# Altium footprint library Connectors.PcbLib: 79 footprints (part 4 of 5)
Each footprint in its own frame and in the unit in brackets; x right, y up, seen from the top. Pads: shape width x height; smd on the part's side, far side on the other; paste and mask are expansions set on the pad; w line width, h text height; cw(c..) or ccw(c..) is an arc to the next point about the centre after c.
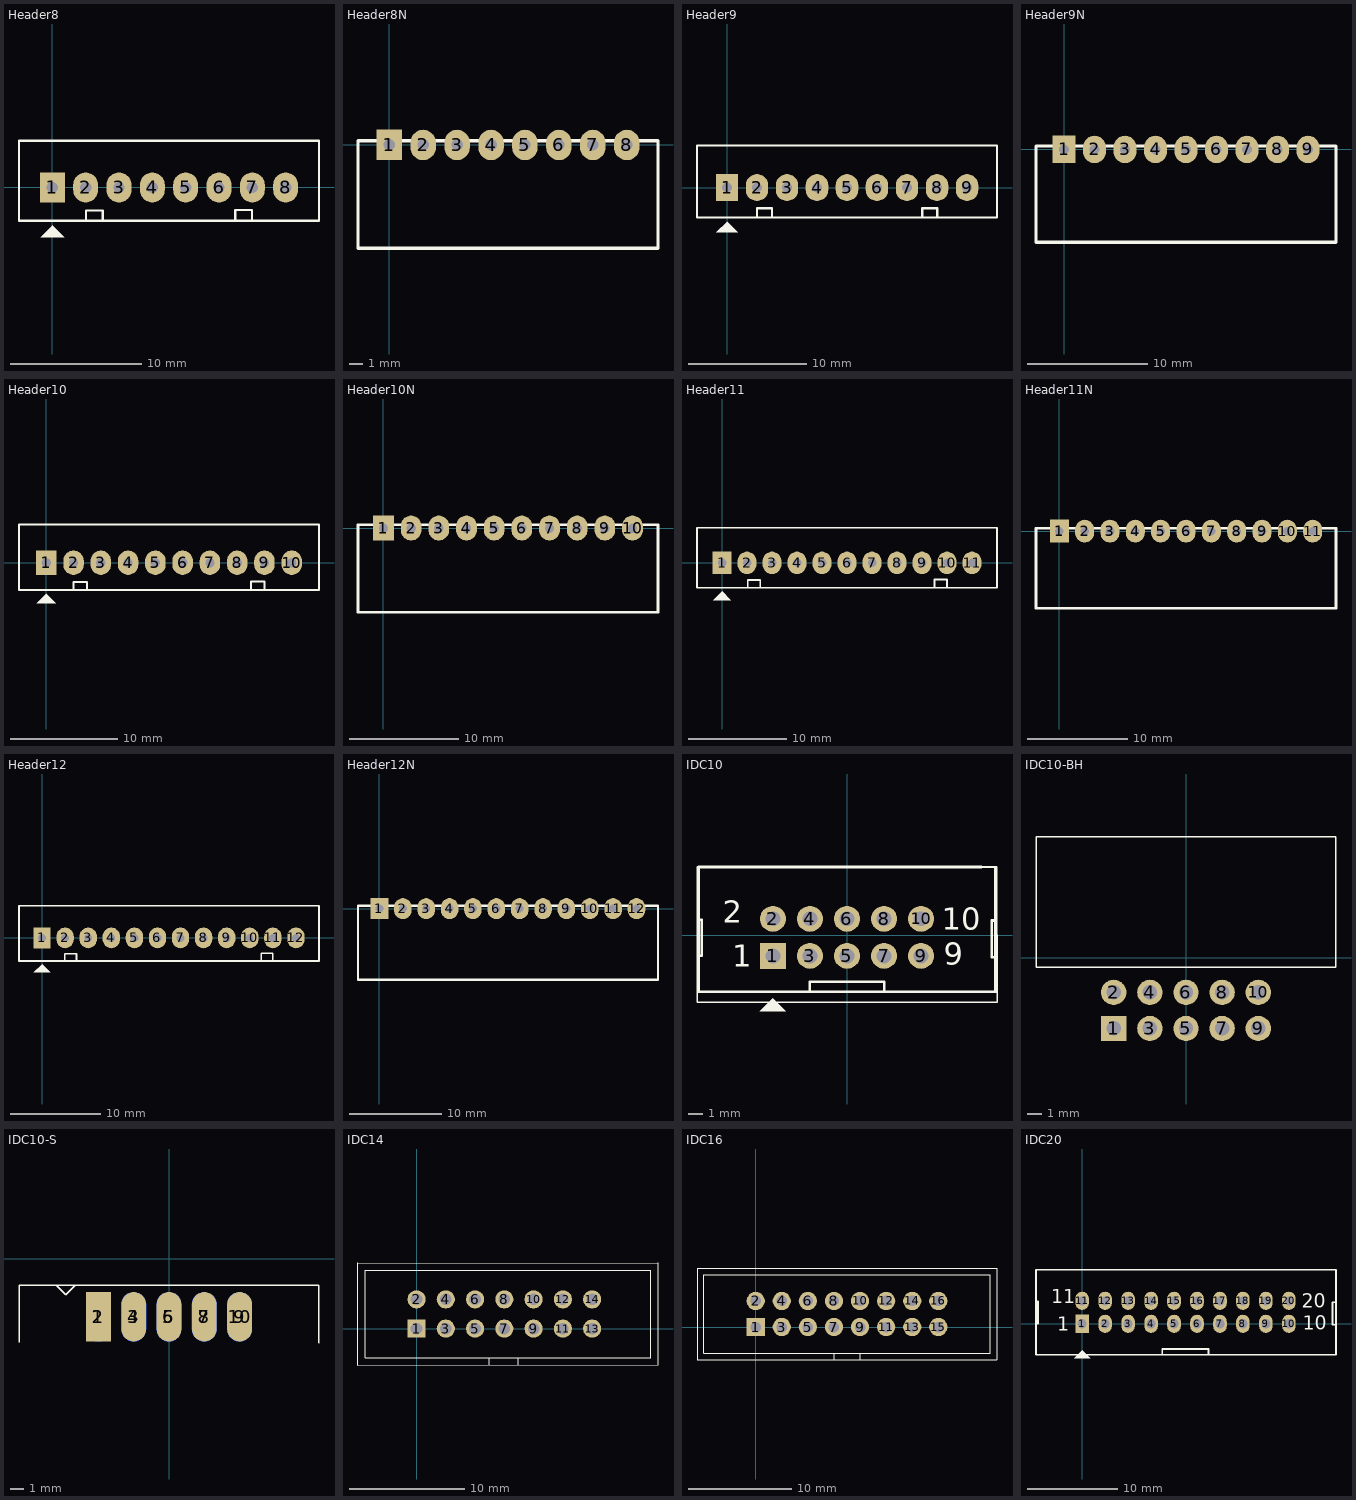
[diagram p3: the footprints below, top view; thin cyan lines are the x and y axes]

## Header8 [mil] "CON8"
height 200
pads (8):
  rect 75x90 hole 34: 1(0,0)
  oval 75x90 hole 34: 2(100,0) 3(200,0) 4(300,0) 5(400,0) 6(500,0) 7(600,0) 8(700,0)
Top Overlay:
  region: -35.5,-149.5 35.5,-149.5 0.5,-114.5 0.5,-113.5
  lines w7: 101,-99 101,-69 151,-69 151,-99 ; 549,-98 549,-68 599,-68 599,-98 ; -100,-100 800,-100 800,0 800,140 -100,140 -100,-100
3D body "JST - XH - Thru V - 8Pin - 2.54mm.stp": height 284, standoff -118, extent -92,-98 792,132

## Header8N [mil] "CON8"
height 200
pads (8):
  rect 75x90 hole 34: 1(0,0)
  oval 75x90 hole 34: 2(100,0) 3(200,0) 4(300,0) 5(400,0) 6(500,0) 7(600,0) 8(700,0)
Top Overlay:
  lines w10: -92,-304.47 792,-304.47 792,11.92 -92,11.92 -92,-304.47
3D body "JST - XH - Thru R - 8Pin - 2.54mm.stp": height 230, standoff -133, extent -92,-304.47 792,11.92

## Header9 [mil] "CON9"
height 200
pads (9):
  rect 75x90 hole 34: 1(0,0)
  oval 75x90 hole 34: 2(100,0) 3(200,0) 4(300,0) 5(400,0) 6(500,0) 7(600,0) 8(700,0) 9(800,0)
Top Overlay:
  region: -35.5,-149.5 35.5,-149.5 0.5,-114.5 0.5,-113.5
  lines w7: 100,-99 100,-69 150,-69 150,-99 ; 651,-99 651,-69 701,-69 701,-99 ; -100,-100 -100,140 900,140 900,0 900,-100 -100,-100
3D body "JST - XH - Thru V - 9Pin - 2.54mm.stp": height 284, standoff -118, extent -92,-98 892,132

## Header9N [mil] "CON9"
height 200
pads (9):
  rect 75x90 hole 34: 1(0,0)
  oval 75x90 hole 34: 2(100,0) 3(200,0) 4(300,0) 5(400,0) 6(500,0) 7(600,0) 8(700,0) 9(800,0)
Top Overlay:
  lines w10: -92,-304.47 892,-304.47 892,11.92 -92,11.92 -92,-304.47
3D body "JST - XH - Thru R - 9Pin - 2.54mm.stp": height 230, standoff -133, extent -92,-304.47 892,11.92

## Header10 [mil] "CON10"
height 200
pads (10):
  rect 75x90 hole 34: 1(0,0)
  oval 75x90 hole 34: 2(100,0) 3(200,0) 4(300,0) 5(400,0) 6(500,0) 7(600,0) 8(700,0) 9(800,0) 10(900,0)
Top Overlay:
  region: -35.5,-149.5 35.5,-149.5 0.5,-114.5 0.5,-113.5
  lines w7: 100,-100 100,-70 150,-70 150,-100 ; 750,-99 750,-69 800,-69 800,-99 ; -100,-100 -100,140 1000,140 1000,0 1000,-100 -100,-100
3D body "JST - XH - Thru V - 10Pin - 2.54mm.stp": height 284, standoff -118, extent -92,-98 992,132

## Header10N [mil] "CON10"
height 200
pads (10):
  rect 75x90 hole 34: 1(0,0)
  oval 75x90 hole 34: 2(100,0) 3(200,0) 4(300,0) 5(400,0) 6(500,0) 7(600,0) 8(700,0) 9(800,0) 10(900,0)
Top Overlay:
  lines w10: -92,-304.47 992,-304.47 992,11.92 -92,11.92 -92,-304.47
3D body "JST - XH - Thru R - 10Pin - 2.54mm.stp": height 230, standoff -133, extent -92,-304.47 992,11.92

## Header11 [mil] "CON11"
height 200
pads (11):
  rect 75x90 hole 34: 1(0,0)
  oval 75x90 hole 34: 2(100,0) 3(200,0) 4(300,0) 5(400,0) 6(500,0) 7(600,0) 8(700,0) 9(800,0) 10(900,0) 11(1000,0)
Top Overlay:
  region: -35.5,-149.5 35.5,-149.5 0.5,-114.5 0.5,-113.5
  lines w7: 103,-99 103,-69 153,-69 153,-99 ; 850,-97 850,-67 900,-67 900,-97 ; -100,-100 -100,140 1100,140 1100,0 1100,-100 -100,-100
3D body "JST - XH - Thru V - 11Pin - 2.54mm.stp": height 284, standoff -118, extent -92,-98 1092,132

## Header11N [mil] "CON11"
height 200
pads (11):
  rect 75x90 hole 34: 1(0,0)
  oval 75x90 hole 34: 2(100,0) 3(200,0) 4(300,0) 5(400,0) 6(500,0) 7(600,0) 8(700,0) 9(800,0) 10(900,0) 11(1000,0)
Top Overlay:
  lines w10: -92,-304.45 1092,-304.45 1092,11.15 -92,11.15 -92,-304.45
3D body "JST - XH - Thru R - 11Pin - 2.54mm.stp": height 230, standoff -133, extent -92,-304.47 1092,11.92

## Header12 [mil] "CON12"
height 200
pads (12):
  rect 75x90 hole 34: 1(0,0)
  oval 75x90 hole 34: 2(100,0) 3(200,0) 4(300,0) 5(400,0) 6(500,0) 7(600,0) 8(700,0) 9(800,0) 10(900,0) 11(1000,0) 12(1100,0)
Top Overlay:
  region: -35.5,-149.5 35.5,-149.5 0.5,-114.5 0.5,-113.5
  lines w7: 99,-99 99,-69 149,-69 149,-99 ; 950,-97 950,-67 1000,-67 1000,-97 ; -100,-100 -100,140 1200,140 1200,0 1200,-100 -100,-100
3D body "JST - XH - Thru V - 12Pin - 2.54mm.stp": height 284, standoff -118, extent -92,-98 1192,132

## Header12N [mil] "CON12"
height 200
pads (12):
  rect 75x90 hole 34: 1(0,0)
  oval 75x90 hole 34: 2(100,0) 3(200,0) 4(300,0) 5(400,0) 6(500,0) 7(600,0) 8(700,0) 9(800,0) 10(900,0) 11(1000,0) 12(1100,0)
Top Overlay:
  lines w10: -92,-304.47 1192,-304.47 1192,11.92 -92,11.92 -92,-304.47
3D body "JST - XH - Thru R - 12Pin - 2.54mm.stp": height 230, standoff -133, extent -92,-304.47 1192,11.92

## IDC10 [mil]
pads (10):
  rect 70x70 hole 40: 1(-200,-55)
  round 70 hole 40: 2(-200,45) 3(-100,-55) 4(-100,45) 5(0,-55) 6(0,45) 7(100,-55) 8(100,45) 9(200,-55) 10(200,45)
Top Overlay:
  region: -200,-170 -235,-205 -165,-205
  lines w4: -405,-180 -405,186 405,186 405,-180 -405,-180
  lines w5: 362.79,185 400,185 400,140 401,140
  lines w7: -400.79,-55.98 -399.8,-55 -391.93,-55 -391.93,42.44 -400.79,42.44 ; -100.59,-151 -100.59,-125 100.2,-125 100.2,-152 ; 398.56,-151.44 401,-149 ; 401,-59 391,-59 391,40.41 401,40.41 ; 402,-152.44 -400.79,-152.44 -400.79,185 ; -400.79,185 362.79,185 -400.79,185 ; 401,-149 401,146 401,-149
  text "10" at 256,16 h60
  text "9" at 261,-79 h60
  text "2" at -335,35 h60
  text "1" at -309.25,-84.53 h60
3D body "User Library-IDC-10M.STEP": height 366.14, standoff -122.05, extent -399.6,-178.23 399.61,180.04

## IDC10-BH [mil]
pads (10):
  rect 70x70 hole 40: 1(-200,-195)
  round 70 hole 40: 2(-200,-95) 3(-100,-195) 4(-100,-95) 5(0,-195) 6(0,-95) 7(100,-195) 8(100,-95) 9(200,-195) 10(200,-95)
Top Overlay:
  lines w4: -415,-25 -415,335 415,335 415,-25 -415,-25
3D body "User Library-IDC Socket Male 10pin Angled THT Goldplated 2_54mm.step": height 353.54, standoff -93.31, extent -412.2,-203.86 412.2,330

## IDC10-S [mil]
pads (10):
  rect 70x140 smd: 1(-200,-165)
  oval 70x140 smd far side: 2(-200,-165) 4(-100,-165) 6(0,-165) 8(100,-165) 10(200,-165)
  oval 70x140 smd: 3(-100,-165) 5(0,-165) 7(100,-165) 9(200,-165)
Top Overlay:
  lines w4: -319,-75 -292,-102 -265,-75 ; -425,-237 -425,-75 425,-75 425,-239 ; -425,-237 -425,-237 ; 425,-239 425,-239
3D body: height 150, standoff -150, extent -424.5,-67.5 425,18
3D body: height 150, standoff 120, extent -425.5,-67.5 425.5,275.5
3D body: height 150, standoff -150, extent -424.5,-67.5 -386,276
3D body: height 150, standoff -150, extent -424.5,-67.5 425,18
3D body: height 150, standoff -150, extent 386.5,-67.5 425,276
3D body: height 150, standoff 120, extent -424.5,-67.5 425,276
3D body: height 30, standoff 10, extent 187.5,-237.5 212.5,236.5
3D body: height 30, standoff 10, extent 87.5,-237.5 112.5,236.5
3D body: height 30, standoff 10, extent -12.5,-237.5 12.5,236.5
3D body: height 30, standoff 10, extent -112.5,-237.5 -87.5,236.5
3D body: height 30, standoff 10, extent -212.5,-237.5 -187.5,236.5
3D body: height 30, standoff 10, extent -212.5,-237.5 -187.5,236.5
3D body: height 30, standoff 10, extent -112.5,-237.5 -87.5,236.5
3D body: height 30, standoff 10, extent -12.5,-237.5 12.5,236.5
3D body: height 30, standoff 10, extent 87.5,-237.5 112.5,236.5
3D body: height 30, standoff 10, extent 187.5,-237.5 212.5,236.5
3D body: height 151, standoff 150, extent -227.75,142 -175.25,257
3D body: height 150, standoff -150, extent 386.5,-67.5 425,276
3D body: height 150, standoff -150, extent -424.5,-67.5 -386,276

## IDC14 [mil]
pads (14):
  rect 62x62 hole 40: 1(0,0)
  round 62 hole 40: 2(0,100) 3(100,0) 4(100,100) 5(200,0) 6(200,100) 7(300,0) 8(300,100) 9(400,0) 10(400,100) 11(500,0) 12(500,100) 13(600,0) 14(600,100)
Top Overlay:
  lines w4: 248,-125 248,-100 ; 348,-125 348,-100 ; 824,224 -200,225 -200,-125 825,-124 ; 825,-125 825,225 ; -175,-100 -175,200 800,200 800,-100 300,-100 -175,-100
3D body: height 300, standoff -120, extent 587.5,87.5 612.5,112.5
3D body: height 300, standoff -120, extent 587.5,-12.5 612.5,12.5
3D body: height 300, standoff -120, extent 487.5,87.5 512.5,112.5
3D body: height 300, standoff -120, extent 487.5,-12.5 512.5,12.5
3D body: height 300, standoff -120, extent -12.5,-12.5 12.5,12.5
3D body: height 300, standoff -120, extent 87.5,-12.5 112.5,12.5
3D body: height 300, standoff -120, extent 187.5,-12.5 212.5,12.5
3D body: height 300, standoff -120, extent 287.5,-12.5 312.5,12.5
3D body: height 300, standoff -120, extent 387.5,-12.5 412.5,12.5
3D body: height 300, standoff -120, extent 387.5,87.5 412.5,112.5
3D body: height 300, standoff -120, extent 287.5,87.5 312.5,112.5
3D body: height 300, standoff -120, extent 187.5,87.5 212.5,112.5
3D body: height 300, standoff -120, extent 87.5,87.5 112.5,112.5
3D body: height 300, standoff -120, extent -12.5,87.5 12.5,112.5
3D body: height 102.36, standoff 0, extent -200.5,-125 825,225
3D body: height 358.27, standoff 0, extent -201.5,-125 824.5,225

## IDC16 [mil]
pads (16):
  rect 70x70 hole 40: 1(0,0)
  round 70 hole 40: 2(0,100) 3(100,0) 4(100,100) 5(200,0) 6(200,100) 7(300,0) 8(300,100) 9(400,0) 10(400,100) 11(500,0) 12(500,100) 13(600,0) 14(600,100) 15(700,0) 16(700,100)
Top Overlay:
  lines w4: 300,-125 300,-100 ; 400,-125 400,-100 ; -225,-125 -225,225 925,225 925,-125 -225,-125 ; -200,-100 900,-100 900,200 -200,200 -200,-100
3D body: height 300, standoff -120, extent 687.5,-12.5 712.5,12.5
3D body: height 300, standoff -120, extent 687.5,87.5 712.5,112.5
3D body: height 300, standoff -120, extent 587.5,87.5 612.5,112.5
3D body: height 300, standoff -120, extent 587.5,-12.5 612.5,12.5
3D body: height 300, standoff -120, extent 487.5,87.5 512.5,112.5
3D body: height 300, standoff -120, extent 487.5,-12.5 512.5,12.5
3D body: height 300, standoff -120, extent -12.5,-12.5 12.5,12.5
3D body: height 300, standoff -120, extent 87.5,-12.5 112.5,12.5
3D body: height 300, standoff -120, extent 187.5,-12.5 212.5,12.5
3D body: height 300, standoff -120, extent 287.5,-12.5 312.5,12.5
3D body: height 300, standoff -120, extent 387.5,-12.5 412.5,12.5
3D body: height 300, standoff -120, extent 387.5,87.5 412.5,112.5
3D body: height 300, standoff -120, extent 287.5,87.5 312.5,112.5
3D body: height 300, standoff -120, extent 187.5,87.5 212.5,112.5
3D body: height 300, standoff -120, extent 87.5,87.5 112.5,112.5
3D body: height 300, standoff -120, extent -12.5,87.5 12.5,112.5
3D body: height 102.36, standoff 0, extent -225,-125 924.5,225
3D body: height 358.27, standoff 0, extent -224.5,-125 925.5,225

## IDC20 [mm] "Header 10x2,20 pin, connecter"
height 7.62
pads (20):
  rect 1.5x2 hole 1: 1(0,0)
  oval 1.5x2 hole 1: 2(2.54,0) 3(5.08,0) 4(7.62,0) 5(10.16,0) 6(12.7,0) 7(15.24,0) 8(17.78,0) 9(20.32,0) 10(22.86,0) 11(0,2.54) 12(2.54,2.54) 13(5.08,2.54) 14(7.62,2.54) 15(10.16,2.54) 16(12.7,2.54) 17(15.24,2.54) 18(17.78,2.54) 19(20.32,2.54) 20(22.86,2.54)
Top Overlay:
  region: 0,-2.921 -0.889,-3.81 0.889,-3.81
  lines w0.178: -5.1,-0.025 -5.075,0 -4.875,0 -4.875,2.475 -5.1,2.475 ; 8.875,-3.394 8.875,-2.794 13.975,-2.794 13.975,-3.344 14.025,-3.394 ; 27.94,-0.127 27.686,-0.127 27.686,2.398 27.94,2.398 ; -5.1,-3.429 28.067,-3.429 28.067,5.969 -5.1,5.969 -5.1,-3.429
  text "20" at 24.257,1.778 h1.52
  text "10" at 24.384,-0.635 h1.52
  text "11" at -3.429,2.286 h1.52
  text "1" at -2.775,-0.75 h1.52
3D body "20 vuong.step": height 9.1, standoff -3, extent -5.094,-3.407 28.106,5.893